# Altium footprint library 2.00-DIP-SOP、SOIC、ESOP、TSSOP、ETSSOP封装.PcbLib: 179 footprints (part 11 of 12)
Each footprint in its own frame and in the unit in brackets; x right, y up, seen from the top. Pads: shape width x height; smd on the part's side, far side on the other; paste and mask are expansions set on the pad; w line width, h text height; cw(c..) or ccw(c..) is an arc to the next point about the centre after c.
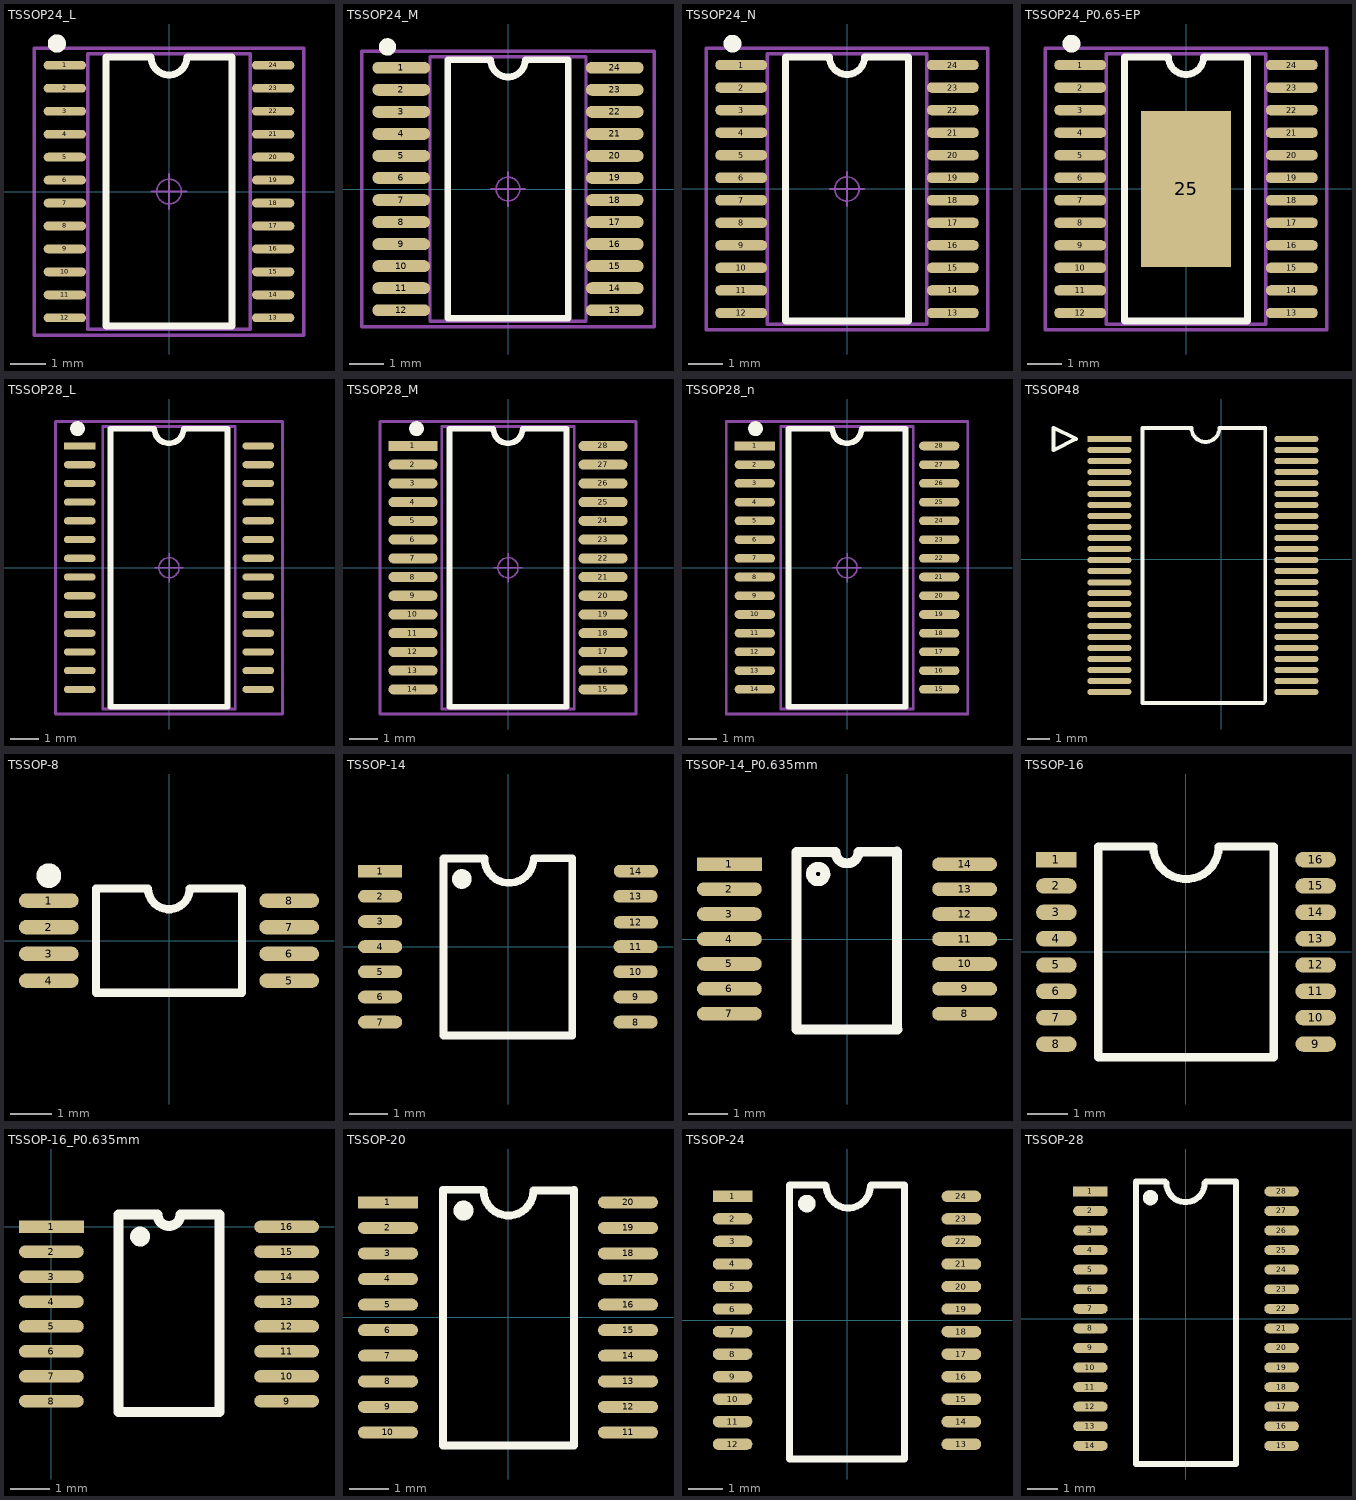
[diagram p10: the footprints below, top view; thin cyan lines are the x and y axes]

## TSSOP24_L [mm] "7.8*6.4*1mm（长宽高）"
pads (24):
  oval 1.2x0.25 smd: 1(-2.95,3.575) 2(-2.95,2.925) 3(-2.95,2.275) 4(-2.95,1.625) 5(-2.95,0.975) 6(-2.95,0.325) 7(-2.95,-0.325) 8(-2.95,-0.975) 9(-2.95,-1.625) 10(-2.95,-2.275) 11(-2.95,-2.925) 12(-2.95,-3.575) 13(2.95,-3.575) 14(2.95,-2.925) 15(2.95,-2.275) 16(2.95,-1.625) 17(2.95,-0.975) 18(2.95,-0.325) 19(2.95,0.325) 20(2.95,0.975) 21(2.95,1.625) 22(2.95,2.275) 23(2.95,2.925) 24(2.95,3.575)
Top Overlay:
  circle w0.254: c-3.175,4.191 r0.13
  lines w0.2: -1.778,-3.81 1.778,-3.81 1.778,3.81 0.508,3.81 cw(c0,3.81) -0.508,3.81 -1.778,3.81 -1.778,-3.81
Mechanical 13:
  lines w0.1: -2.3,-3.9 -2.3,3.9 2.3,3.9 2.3,-3.9 -2.3,-3.9
Mechanical 15:
  circle w0.05: c0,0 r0.35
  lines w0.05: -0.5,0 0.5,0 ; 0,-0.5 0,0.5
  lines w0.1: -3.81,-4.064 -3.81,4.064 3.81,4.064 3.81,-4.064 -3.81,-4.064
3D body "TSSOP24.STEP": height 1.03, standoff -0.02, extent -3.202,-3.9 3.202,3.9

## TSSOP24_M [mm] "7.8*6.4*1mm（长宽高）"
pads (24):
  oval 1.7x0.35 smd: 1(-3.15,3.575) 2(-3.15,2.925) 3(-3.15,2.275) 4(-3.15,1.625) 5(-3.15,0.975) 6(-3.15,0.325) 7(-3.15,-0.325) 8(-3.15,-0.975) 9(-3.15,-1.625) 10(-3.15,-2.275) 11(-3.15,-2.925) 12(-3.15,-3.575) 13(3.15,-3.575) 14(3.15,-2.925) 15(3.15,-2.275) 16(3.15,-1.625) 17(3.15,-0.975) 18(3.15,-0.325) 19(3.15,0.325) 20(3.15,0.975) 21(3.15,1.625) 22(3.15,2.275) 23(3.15,2.925) 24(3.15,3.575)
Top Overlay:
  circle w0.254: c-3.556,4.191 r0.13
  lines w0.2: -1.778,-3.81 1.778,-3.81 1.778,3.81 0.508,3.81 cw(c0,3.81) -0.508,3.81 -1.778,3.81 -1.778,-3.81
Mechanical 13:
  lines w0.1: -2.3,-3.9 2.3,-3.9 2.3,3.9 -2.3,3.9 -2.3,-3.9
Mechanical 15:
  circle w0.05: c0,0 r0.35
  lines w0.05: -0.5,0 0.5,0 ; 0,-0.5 0,0.5
  lines w0.1: -4.318,-4.064 4.318,-4.064 4.318,4.064 -4.318,4.064 -4.318,-4.064
3D body "TSSOP24.STEP": height 1.03, standoff -0.02, extent -3.202,-3.9 3.202,3.9

## TSSOP24_N [mm] "7.8*6.4*1mm（长宽高）   封装库来自淘宝卖家 ID：黄晶宝石"
pads (24):
  oval 1.5x0.3 smd: 1(-3.05,3.575) 2(-3.05,2.925) 3(-3.05,2.275) 4(-3.05,1.625) 5(-3.05,0.975) 6(-3.05,0.325) 7(-3.05,-0.325) 8(-3.05,-0.975) 9(-3.05,-1.625) 10(-3.05,-2.275) 11(-3.05,-2.925) 12(-3.05,-3.575) 13(3.05,-3.575) 14(3.05,-2.925) 15(3.05,-2.275) 16(3.05,-1.625) 17(3.05,-0.975) 18(3.05,-0.325) 19(3.05,0.325) 20(3.05,0.975) 21(3.05,1.625) 22(3.05,2.275) 23(3.05,2.925) 24(3.05,3.575)
Top Overlay:
  circle w0.254: c-3.302,4.191 r0.13
  lines w0.2: -1.778,-3.81 -1.778,3.81 -0.508,3.81 ccw(c0,3.81) 0.508,3.81 1.778,3.81 1.778,-3.81 -1.778,-3.81
Mechanical 13:
  lines w0.1: -2.3,-3.9 -2.3,3.9 2.3,3.9 2.3,-3.9 -2.3,-3.9
Mechanical 15:
  circle w0.05: c0,0 r0.35
  lines w0.05: -0.5,0 0.5,0 ; 0,-0.5 0,0.5
  lines w0.1: -4.064,-4.064 -4.064,4.064 4.064,4.064 4.064,-4.064 -4.064,-4.064
3D body "TSSOP24.STEP": height 1.03, standoff -0.02, extent -3.202,-3.9 3.202,3.9

## TSSOP24_P0.65-EP [mm] "Shrink Small Outline; 24 Leads; Body Width 4.4 mm; Pitch 0.65 mm"
pads (25):
  oval 1.5x0.3 smd: 1(-3.05,3.575) 2(-3.05,2.925) 3(-3.05,2.275) 4(-3.05,1.625) 5(-3.05,0.975) 6(-3.05,0.325) 7(-3.05,-0.325) 8(-3.05,-0.975) 9(-3.05,-1.625) 10(-3.05,-2.275) 11(-3.05,-2.925) 12(-3.05,-3.575) 13(3.05,-3.575) 14(3.05,-2.925) 15(3.05,-2.275) 16(3.05,-1.625) 17(3.05,-0.975) 18(3.05,-0.325) 19(3.05,0.325) 20(3.05,0.975) 21(3.05,1.625) 22(3.05,2.275) 23(3.05,2.925) 24(3.05,3.575)
  rect 2.6x4.5 smd: 25(0,0)
Top Overlay:
  circle w0.254: c-3.302,4.191 r0.13
  lines w0.2: -1.778,-3.81 1.778,-3.81 1.778,3.81 0.508,3.81 cw(c0,3.81) -0.508,3.81 -1.778,3.81 -1.778,-3.81
Mechanical 13:
  lines w0.1: -2.3,-3.9 2.3,-3.9 2.3,3.9 -2.3,3.9 -2.3,-3.9
Mechanical 15:
  circle w0.05: c0,0 r0.35
  lines w0.05: -0.5,0 0.5,0 ; 0,-0.5 0,0.5
  lines w0.1: -4.064,-4.064 4.064,-4.064 4.064,4.064 -4.064,4.064 -4.064,-4.064
3D body "TSSOP24.STEP": height 1.03, standoff -0.02, extent -3.202,-3.9 3.202,3.9

## TSSOP28_L [mm] "9.8*6.4*1mm（长宽高）"
pads (28):
  rect 1.1x0.25 smd: 1(-3.1,4.225)
  oval 1.1x0.25 smd: 2(-3.1,3.575) 3(-3.1,2.925) 4(-3.1,2.275) 5(-3.1,1.625) 6(-3.1,0.975) 7(-3.1,0.325) 8(-3.1,-0.325) 9(-3.1,-0.975) 10(-3.1,-1.625) 11(-3.1,-2.275) 12(-3.1,-2.925) 13(-3.1,-3.575) 14(-3.1,-4.225) 15(3.1,-4.225) 16(3.1,-3.575) 17(3.1,-2.925) 18(3.1,-2.275) 19(3.1,-1.625) 20(3.1,-0.975) 21(3.1,-0.325) 22(3.1,0.325) 23(3.1,0.975) 24(3.1,1.625) 25(3.1,2.275) 26(3.1,2.925) 27(3.1,3.575) 28(3.1,4.225)
Top Overlay:
  circle w0.254: c-3.175,4.826 r0.13
  lines w0.2: -2.032,-4.826 -2.032,4.826 -0.508,4.826 ccw(c0,4.826) 0.508,4.826 2.032,4.826 2.032,-4.826 -2.032,-4.826
Mechanical 13:
  lines w0.1: -2.3,-4.9 2.3,-4.9 2.3,4.9 -2.3,4.9 -2.3,-4.9
Mechanical 15:
  circle w0.05: c0,0 r0.35
  lines w0.05: -0.5,0 0.5,0 ; 0,-0.5 0,0.5
  lines w0.1: -3.937,-5.08 3.937,-5.08 3.937,5.08 -3.937,5.08 -3.937,-5.08
3D body "TSSOP28.STEP": height 1.03, standoff -0.02, extent -3.202,-4.9 3.202,4.9

## TSSOP28_M [mm] "9.8*6.4*1mm（长宽高）"
pads (28):
  rect 1.7x0.35 smd: 1(-3.3,4.225)
  oval 1.7x0.35 smd: 2(-3.3,3.575) 3(-3.3,2.925) 4(-3.3,2.275) 5(-3.3,1.625) 6(-3.3,0.975) 7(-3.3,0.325) 8(-3.3,-0.325) 9(-3.3,-0.975) 10(-3.3,-1.625) 11(-3.3,-2.275) 12(-3.3,-2.925) 13(-3.3,-3.575) 14(-3.3,-4.225) 15(3.3,-4.225) 16(3.3,-3.575) 17(3.3,-2.925) 18(3.3,-2.275) 19(3.3,-1.625) 20(3.3,-0.975) 21(3.3,-0.325) 22(3.3,0.325) 23(3.3,0.975) 24(3.3,1.625) 25(3.3,2.275) 26(3.3,2.925) 27(3.3,3.575) 28(3.3,4.225)
Top Overlay:
  circle w0.254: c-3.175,4.826 r0.13
  lines w0.2: -2.032,-4.826 2.032,-4.826 2.032,4.826 0.508,4.826 cw(c0,4.826) -0.508,4.826 -2.032,4.826 -2.032,-4.826
Mechanical 13:
  lines w0.1: -2.3,-4.9 -2.3,4.9 2.3,4.9 2.3,-4.9 -2.3,-4.9
Mechanical 15:
  circle w0.05: c0,0 r0.35
  lines w0.05: -0.5,0 0.5,0 ; 0,-0.5 0,0.5
  lines w0.1: -4.445,-5.08 4.445,-5.08 4.445,5.08 -4.445,5.08 -4.445,-5.08
3D body "TSSOP28.STEP": height 1.03, standoff -0.02, extent -3.202,-4.9 3.202,4.9

## TSSOP28_n [mm] "9.8*6.4*1mm（长宽高） 封装库来自淘宝卖家 ID：黄晶宝石"
pads (28):
  rect 1.4x0.3 smd: 1(-3.2,4.225)
  oval 1.4x0.3 smd: 2(-3.2,3.575) 3(-3.2,2.925) 4(-3.2,2.275) 5(-3.2,1.625) 6(-3.2,0.975) 7(-3.2,0.325) 8(-3.2,-0.325) 9(-3.2,-0.975) 10(-3.2,-1.625) 11(-3.2,-2.275) 12(-3.2,-2.925) 13(-3.2,-3.575) 14(-3.2,-4.225) 15(3.2,-4.225) 16(3.2,-3.575) 17(3.2,-2.925) 18(3.2,-2.275) 19(3.2,-1.625) 20(3.2,-0.975) 21(3.2,-0.325) 22(3.2,0.325) 23(3.2,0.975) 24(3.2,1.625) 25(3.2,2.275) 26(3.2,2.925) 27(3.2,3.575) 28(3.2,4.225)
Top Overlay:
  circle w0.254: c-3.175,4.826 r0.13
  lines w0.2: -2.032,-4.826 2.032,-4.826 2.032,4.826 0.508,4.826 cw(c0,4.826) -0.508,4.826 -2.032,4.826 -2.032,-4.826
Mechanical 13:
  lines w0.1: -2.3,-4.9 -2.3,4.9 2.3,4.9 2.3,-4.9 -2.3,-4.9
Mechanical 15:
  circle w0.05: c0,0 r0.35
  lines w0.05: -0.5,0 0.5,0 ; 0,-0.5 0,0.5
  lines w0.1: -4.191,-5.08 -4.191,5.08 4.191,5.08 4.191,-5.08 -4.191,-5.08
3D body "TSSOP28.STEP": height 1.03, standoff -0.02, extent -3.202,-4.9 3.202,4.9

## TSSOP48 [mm]
pads (48):
  rect 2x0.279 smd: 1(-5.08,5.461)
  oval 2x0.279 smd: 2(-5.08,4.961) 3(-5.08,4.461) 4(-5.08,3.961) 5(-5.08,3.461) 6(-5.08,2.961) 7(-5.08,2.461) 8(-5.08,1.961) 9(-5.08,1.461) 10(-5.08,0.961) 11(-5.08,0.461) 12(-5.08,-0.039) 13(-5.08,-0.539) 14(-5.08,-1.059) 15(-5.08,-1.539) 16(-5.08,-2.039) 17(-5.08,-2.539) 18(-5.08,-3.039) 19(-5.08,-3.539) 20(-5.08,-4.039) 21(-5.08,-4.539) 22(-5.08,-5.039) 23(-5.08,-5.539) 24(-5.08,-6.039) 25(3.42,-6.039) 26(3.42,-5.539) 27(3.42,-5.039) 28(3.42,-4.539) 29(3.42,-4.039) 30(3.42,-3.539) 31(3.42,-3.039) 32(3.42,-2.539) 33(3.42,-2.039) 34(3.42,-1.539) 35(3.42,-1.039) 36(3.42,-0.539) 37(3.42,-0.039) 38(3.42,0.461) 39(3.42,0.961) 40(3.42,1.461) 41(3.42,1.961) 42(3.42,2.461) 43(3.42,2.961) 44(3.42,3.461) 45(3.42,3.961) 46(3.42,4.461) 47(3.42,4.961) 48(3.42,5.461)
Top Overlay:
  lines w0.178: 1.92,-6.539 2.001,-6.458 ; 1.92,-6.539 -3.58,-6.539 -3.58,5.961 -1.35,5.961 ccw(c-0.715,5.961) -0.08,5.961 2.001,5.961 2.001,-6.458 ; 1.92,-6.539 2.001,-6.458 ; -7.62,4.953 -7.62,5.969 -6.604,5.461 -7.62,4.953
3D body "TSSOP48.STEP": height 1.1, standoff 0.02, extent -5.059,-6.615 3.141,5.885

## TSSOP-8 [mm] "TSSOP-8_L4.4-W3.0-P0.65  封装库来自淘宝卖家 ID：黄晶宝石"
pads (8):
  oval 1.454x0.353 smd: 1(-2.927,0.975) 2(-2.927,0.325) 3(-2.927,-0.325) 4(-2.927,-0.975) 5(2.927,-0.975) 6(2.927,-0.325) 7(2.927,0.325) 8(2.927,0.975)
Top Overlay:
  circle w0.3: c-2.927,1.581 r0.15
  lines w0.2: -1.78,-1.27 1.776,-1.27 1.776,1.27 0.506,1.27 cw(c-0.002,1.27) -0.51,1.27 -1.78,1.27 -1.78,-1.27
3D body "TSSOP-8 .STEP": height 1.12, standoff 0.02, extent -3.19,-1.575 3.09,1.425

## TSSOP-14 [mm] "4.96x4.40x1.00 e=0.65 封装库来自淘宝卖家 ID：黄晶宝石"
pads (14):
  rect 1.143x0.33 smd: 1(-3.304,1.95)
  oval 1.143x0.33 smd: 2(-3.304,1.3) 3(-3.304,0.65) 4(-3.304,0) 5(-3.304,-0.65) 6(-3.304,-1.3) 7(-3.304,-1.95) 8(3.296,-1.95) 9(3.296,-1.3) 10(3.296,-0.65) 11(3.296,0) 12(3.304,0.629) 13(3.296,1.3) 14(3.304,1.95)
Top Overlay:
  circle w0.254: c-1.192,1.747 r0.127
  lines w0.2: -0.617,2.275 -1.669,2.275 -1.669,-2.299 1.661,-2.299 1.661,2.275 ; -0.608,2.28 ccw(c0.027,2.28) 0.662,2.28 1.656,2.28
3D body "TSSOP14.STEP": height 1.03, standoff -0.02, extent -3.202,-2.5 3.202,2.5

## TSSOP-14_P0.635mm [mil]
pads (14):
  rect 65x13.78 smd: 1(-118,75)
  oval 65x13.78 smd: 2(-118,50) 3(-118,25) 4(-118,0) 5(-118,-25) 6(-118,-50) 7(-118,-75) 8(118,-75) 9(118,-50) 10(118,-25) 11(118,0) 12(118,25) 13(118,50) 14(118,75)
Top Overlay:
  lines w10: -29,58 cw(c-29,65.21) -27.98,58.07 ; 50,-91 50,88 11.54,87.5 cw(c0,87.5) -11.54,87.5 -50.5,87.5 -50.5,-91 50.5,-91
3D body "TSSOP14.STEP": height 40.55, standoff -0.76, extent -126.06,-98.42 126.07,98.43

## TSSOP-16 [mm]
pads (16):
  rect 1x0.381 smd: 1(-3.2,2.275)
  oval 1x0.381 smd: 2(-3.2,1.625) 3(-3.2,0.975) 4(-3.2,0.325) 5(-3.2,-0.325) 6(-3.2,-0.975) 7(-3.2,-1.625) 8(-3.2,-2.275) 9(3.2,-2.275) 10(3.2,-1.625) 11(3.2,-0.975) 12(3.2,-0.325) 13(3.2,0.325) 14(3.2,0.975) 15(3.2,1.625) 16(3.2,2.275)
Top Overlay:
  lines w0.2: -0.812,2.6 -2.165,2.6 -2.165,-2.6 2.165,-2.6 2.165,2.6 0.813,2.6 ; -0.808,2.6 ccw(c0,2.6) 0.808,2.6
3D body "TSSOP16.STEP": height 1.03, standoff -0.02, extent -3.202,-2.5 3.202,2.5

## TSSOP-16_P0.635mm [mil] "4.96x4.40x1.00  封装库来自淘宝卖家 ID：黄晶宝石"
pads (16):
  rect 65x12.5 smd: 1(0,0)
  oval 65x12.5 smd: 2(0,-25) 3(0,-50) 4(0,-75) 5(0,-100) 6(0,-125) 7(0,-150) 8(0,-175) 9(236,-175) 10(236,-150) 11(236,-125) 12(236,-100) 13(236,-75) 14(236,-50) 15(236,-25) 16(236,0)
Top Overlay:
  lines w10: 89,-14.79 cw(c89,-9.79) 89.71,-14.74 ; 67.5,-186 67.5,12.5 106.46,12.5 ccw(c118,12.5) 129.54,12.5 168.5,12.5 168.5,-186 67.5,-186
3D body "TSSOP16.STEP": height 40.55, standoff -0.76, extent -9.92,-186.02 242.21,10.83

## TSSOP-20 [mm]
pads (20):
  rect 1.524x0.305 smd: 1(-3.05,2.925)
  oval 1.524x0.305 smd: 2(-3.05,2.275) 3(-3.05,1.625) 4(-3.05,0.975) 5(-3.05,0.325) 6(-3.05,-0.325) 7(-3.05,-0.975) 8(-3.05,-1.625) 9(-3.05,-2.275) 10(-3.05,-2.925) 11(3.05,-2.925) 12(3.05,-2.275) 13(3.05,-1.625) 14(3.05,-0.975) 15(3.05,-0.325) 16(3.05,0.325) 17(3.05,0.975) 18(3.05,1.625) 19(3.05,2.275) 20(3.05,2.925)
Top Overlay:
  circle w0.254: c-1.131,2.715 r0.127
  lines w0.2: -0.643,3.243 -1.655,3.243 -1.655,-3.257 1.675,-3.257 1.675,3.243 ; -0.623,3.223 ccw(c0.012,3.223) 0.647,3.223 1.655,3.223
3D body "TSSOP20.STEP": height 1.03, standoff -0.02, extent -3.202,-3.25 3.202,3.25

## TSSOP-24 [mm] "7.80x4.40x1.00 e=0.65 封装库来自淘宝卖家 ID：黄晶宝石"
pads (24):
  rect 1.143x0.33 smd: 1(-3.3,3.575)
  oval 1.143x0.33 smd: 2(-3.3,2.925) 3(-3.3,2.275) 4(-3.3,1.625) 5(-3.3,0.975) 6(-3.3,0.325) 7(-3.3,-0.325) 8(-3.3,-0.975) 9(-3.3,-1.625) 10(-3.3,-2.275) 11(-3.3,-2.925) 12(-3.3,-3.575) 13(3.3,-3.575) 14(3.3,-2.925) 15(3.3,-2.275) 16(3.3,-1.625) 17(3.3,-0.975) 18(3.3,-0.325) 19(3.3,0.325) 20(3.3,0.975) 21(3.3,1.625) 22(3.3,2.275) 23(3.3,2.925) 24(3.3,3.575)
Top Overlay:
  circle w0.254: c-1.157,3.367 r0.127
  lines w0.2: -0.624,3.9 -1.665,3.9 -1.665,-3.999 1.665,-3.999 1.665,3.9 0.697,3.9 ; -0.598,3.875 ccw(c0.037,3.875) 0.672,3.875
3D body "TSSOP24.STEP": height 1.03, standoff -0.02, extent -3.202,-3.9 3.202,3.9

## TSSOP-28 [mm] "9.70x4.40x1.00 e=0.65  封装库来自淘宝卖家 ID：黄晶宝石"
pads (28):
  rect 1.143x0.33 smd: 1(-3.175,4.225)
  oval 1.143x0.33 smd: 2(-3.175,3.575) 3(-3.175,2.925) 4(-3.175,2.275) 5(-3.175,1.625) 6(-3.175,0.975) 7(-3.175,0.325) 8(-3.175,-0.325) 9(-3.175,-0.975) 10(-3.175,-1.625) 11(-3.175,-2.275) 12(-3.175,-2.925) 13(-3.175,-3.575) 14(-3.175,-4.225) 15(3.175,-4.225) 16(3.175,-3.575) 17(3.175,-2.925) 18(3.175,-2.275) 19(3.175,-1.625) 20(3.175,-0.975) 21(3.175,-0.325) 22(3.175,0.325) 23(3.175,0.975) 24(3.175,1.625) 25(3.175,2.275) 26(3.175,2.925) 27(3.175,3.575) 28(3.175,4.225)
Top Overlay:
  circle w0.254: c-1.182,4.017 r0.127
  lines w0.2: -0.7,4.55 -1.665,4.55 -1.665,-4.829 1.665,-4.829 1.665,4.55 0.672,4.55 ; -0.649,4.499 ccw(c-0.014,4.499) 0.621,4.499
3D body "TSSOP28.STEP": height 1.03, standoff -0.02, extent -3.202,-4.9 3.202,4.9